# Altium footprint library Dart_Controller_Pcblib.PcbLib: 43 footprints (part 1 of 3)
Each footprint in its own frame and in the unit in brackets; x right, y up, seen from the top. Pads: shape width x height; smd on the part's side, far side on the other; paste and mask are expansions set on the pad; w line width, h text height; cw(c..) or ccw(c..) is an arc to the next point about the centre after c.
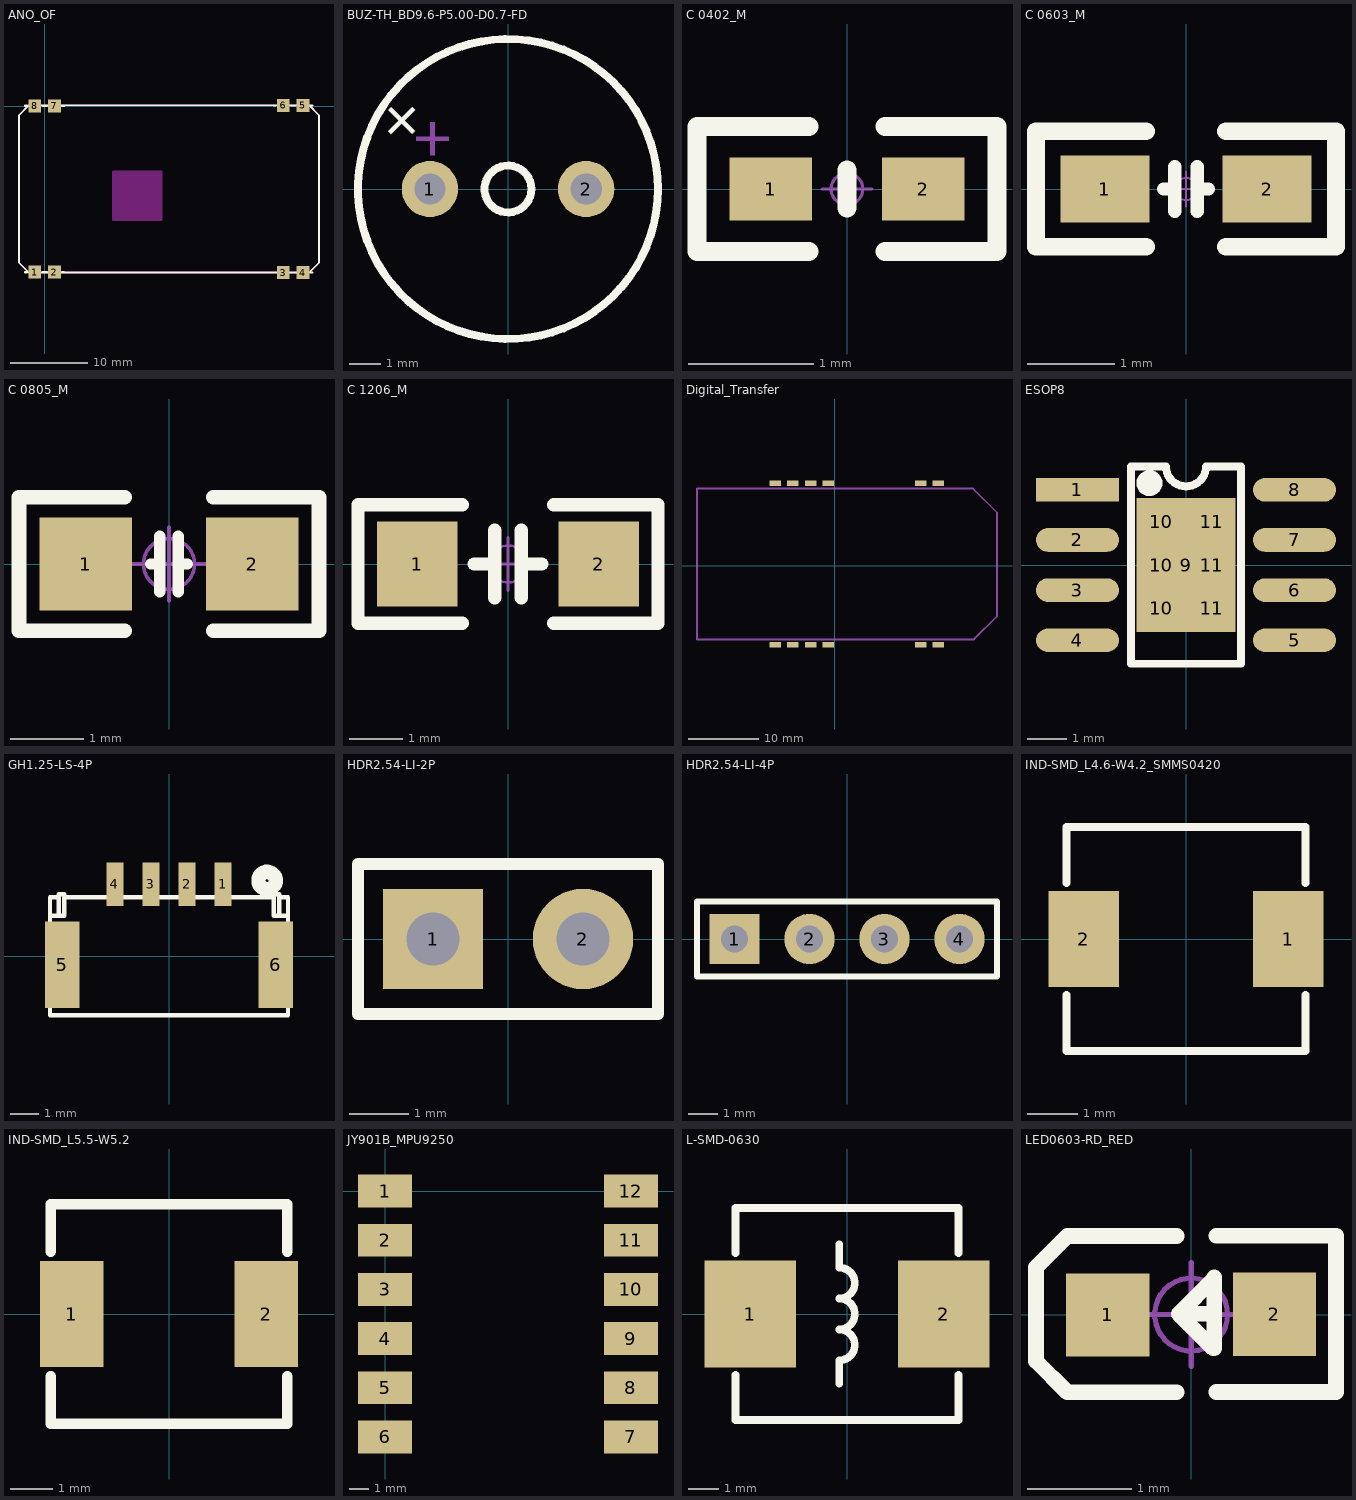
[diagram p0: the footprints below, top view; thin cyan lines are the x and y axes]

## ANO_OF [mil]
pads (8):
  rect 65x65 smd: 1(-50,-843) 2(50,-843) 3(1213,-845) 4(1313,-845) 5(1313,4) 6(1213,4) 7(50,2) 8(-50,2)
Top Overlay:
  lines w12: -98,-843 -89.5,-843 ; -98,2 -89,2 ; -10.5,-843 10.5,-843 ; -10.5,2 10.5,2 ; 89,-843 98,-843 ; 89.5,2 98,2 ; 1165,-845 1174,-845 ; 1165,4 1174,4 ; 1252.5,-845 1273.5,-845 ; 1252.5,4 1273.5,4 ; 1352.5,-845 1361,-845 ; 1352.5,4 1361,4
Top Overlay keep-out:
  lines w7.87: -130,-795 -80,-845 1345,-845 1395,-795 1395,-45 1345,5 -80,5 -130,-45 -130,-795
Keep-Out Layer:
  pour cut-out: 346,-580 596,-580 596,-330 346,-330
Keep-Out Layer:
  lines w8: 346,-580 346,-330 596,-330 596,-580 346,-580

## BUZ-TH_BD9.6-P5.00-D0.7-FD [mm]
pads (2):
  round 1.8 hole 1 paste-2539.97 mask+0.051: 1(-2.5,0) 2(2.5,0)
Top Overlay:
  circle w0.254: c0,0 r4.8
  circle w0.254: c0,0 r0.75
  text "+" at -2.481,2.059 h1.27
Mechanical 15:
  region: -2.484,1.084 -2.344,1.084 -2.344,2.134 -2.484,2.134 -2.484,2.114
  region: -2.939,1.679 -2.939,1.539 -1.889,1.539 -1.889,1.679 -1.909,1.679
3D body "Beeper_CORR.step": height 5.51, standoff -4.5, extent -4.5,-4.5 4.5,4.5

## C 0402_M [mil] "无极性贴片电容                                  淘宝ID:黄晶宝石"
pads (2):
  rect 26x20 smd: 1(-24,0) 2(24,0)
Top Overlay:
  lines w6: -12,-19.68 -47.24,-19.68 -47.24,19.68 -12,19.68 ; 0,-6 0,6 ; 12,-19.68 47.24,-19.68 47.24,19.68 12,19.68
Mechanical 15:
  circle w1: c0,0 r5
  lines w1: -7.87,0 7.87,0 ; 0,-7.87 0,7.87
3D body "C 0402.STEP": height 20.68, standoff 0.21, extent -19.69,-10.24 19.69,10.24

## C 0603_M [mil] "无极性贴片电容                                淘宝ID:黄晶宝石"
pads (2):
  rect 40x30 smd: 1(-36.5,0) 2(36.5,0)
Top Overlay:
  lines w6: -10,0 -5,0 ; -5,-10 -5,10 ; 5,-10 5,10 ; 5,0 10,0
  lines w8: -18,-26 -67.5,-26 -67.5,26 -18,26 ; 18,-26 67.5,-26 67.5,26 18,26
Mechanical 15:
  circle w1: c0,0 r5
  lines w1: -7.87,0 7.87,0 ; 0,-7.87 0,7.87
3D body "C 0603.STEP": height 31.89, standoff -0.39, extent -31.5,-16.14 31.5,16.14

## C 0805_M [mil] "无极性贴片电容                                         淘宝ID:黄晶宝石"
height 19.68
pads (2):
  rect 50x50 smd: 1(-45,0) 2(45,0)
Top Overlay:
  lines w6: -10,0 -5,0 ; -5,-15 -5,15 ; 5,-15 5,15 ; 5,0 10,0
  lines w8: -24,-36 -81,-36 -81,36 -24,36 ; 24,-36 81,-36 81,36 24,36
Mechanical 15:
  circle w1.97: c0,0 r13.78
  lines w1.97: -19.68,0 19.68,0 ; 0,-19.68 0,19.68
3D body "C 0805.STEP": height 20.08, standoff -0.39, extent -39.37,-24.02 39.37,24.02

## C 1206_M [mil] "无极性贴片电容"
pads (2):
  rect 60x62.99 smd: 1(-67.5,0) 2(67.5,0)
Top Overlay:
  lines w10: -34,-44 -111.5,-44 -111.5,44 -34,44 ; -25,0 -10,0 ; -10,-25 -10,25 ; 10,-25 10,25 ; 10,0 25,0 ; 34,-44 111.5,-44 111.5,44 34,44
Mechanical 15:
  circle w1.97: c0,0 r13.78
  lines w1.97: -19.68,0 19.68,0 ; 0,-19.68 0,19.68
3D body "C 1206.STEP": height 47.64, standoff -0.39, extent -62.99,-31.89 62.99,31.89

## Digital_Transfer [mil]
pads (12):
  rect 65x31.5 smd: 0(485,-445) 0(485,465) 0(585,-445) 0(585,465) 1(-335,-445) 2(-235,-445) 3(-135,-445) 4(-35,-445) 5(-35,465) 6(-135,465) 7(-235,465) 8(-335,465)
Mechanical 1:
  lines w10: -775,-415 785,-415 915,-285 915,300 780,435 -775,435 -775,-415

## ESOP8 [mm]
pads (15):
  rect 2.1x0.6 smd: 1(-2.75,1.905)
  oval 2.1x0.6 smd: 2(-2.75,0.635) 3(-2.75,-0.635) 4(-2.75,-1.905) 5(2.75,-1.905) 6(2.75,-0.635) 7(2.75,0.635) 8(2.75,1.905)
  rect 2.5x3.4 smd paste-2: 9(0,0)
  rect 0.9x0.7 on Top Paste: 10(-0.625,-1.1) 10(-0.625,0) 10(-0.625,1.1) 11(0.65,-1.1) 11(0.65,0) 11(0.65,1.1)
Top Overlay:
  circle w0.35: c-0.925,2.075 r0.155
  lines w0.2: -1.397,2.5 -1.397,-2.5 1.397,-2.5 1.397,2.5
  lines w0.203: -1.397,2.5 -0.508,2.5 ccw(c0,2.5) 0,1.992 ccw(c0,2.5) 0.508,2.5 1.397,2.5
Mechanical 15:
  circle w0.05: c0,0 r0.35
  lines w0.05: -0.5,0 0.5,0 ; 0,-0.5 0,0.5
3D body "ESOP8.STEP": height 1.53, standoff -0.01, extent -3.053,-2.5 2.953,2.5

## GH1.25-LS-4P [mm] "A1257WR-S-4P"
height 1.5
pads (6):
  rect 0.6x1.5 smd: 1(1.875,2.5) 2(0.625,2.5) 3(-0.625,2.5) 4(-1.875,2.5)
  rect 1.2x3 smd: 5(-3.7,-0.3) 6(3.7,-0.3)
Top Overlay:
  circle w0.5: c3.401,2.627 r0.3
  lines w0.102: -1.975,2.15 -1.975,2.85 -1.775,2.85 -1.775,2.15 ; -0.725,2.15 -0.725,2.85 -0.525,2.85 -0.525,2.15 ; 0.525,2.15 0.525,2.85 0.725,2.85 0.725,2.15 ; 1.775,2.15 1.775,2.85 1.975,2.85 1.975,2.15
  lines w0.152: -3.825,1.4 -3.825,2.15 -3.625,2.15 -3.625,2.05 ; -3.825,2.05 -4.125,2.05 -4.125,1.4 ; -1.975,2.05 -1.975,2.15 -1.775,2.15 -1.775,2.05 ; -0.725,2.05 -0.725,2.15 -0.525,2.15 -0.525,2.05 ; 0.525,2.05 0.525,2.15 0.725,2.15 0.725,2.05 ; 1.775,2.05 1.775,2.15 1.975,2.15 1.975,2.05 ; 3.825,1.4 3.825,2.15 3.625,2.15 3.625,2.05 ; 3.825,2.05 4.125,2.05 4.125,1.4 ; -4.125,1.4 -3.625,1.4 -3.625,2.05 ; -4.125,1.4 -4.125,-2.05 4.125,-2.05 4.125,1.4 ; -3.625,2.05 3.625,2.05 ; 3.625,2.05 3.625,1.4 4.125,1.4
3D body "A1257WR-S-4P.stp": height 4.2, standoff -0.7, extent -4.125,-2.15 4.125,2.25

## HDR2.54-LI-2P [mm] "封装库来自淘宝卖家 ID：黄晶宝石"
pads (2):
  rect 1.7x1.7 hole 0.9: 1(-1.27,0)
  round 1.7 hole 0.9: 2(1.27,0)
Top Overlay:
  lines w0.2: -2.54,-1.27 2.54,-1.27 2.54,1.27 -2.54,1.27 -2.54,-1.27
3D body "HDR2.54-1P.STEP": height 8.5, standoff -3, extent -2.54,-1.27 0,1.27
3D body "HDR2.54-1P.STEP": height 8.5, standoff -3, extent 0,-1.27 2.54,1.27

## HDR2.54-LI-4P [mm] "排针，4脚"
pads (4):
  rect 1.7x1.7 hole 0.9: 1(-3.81,0)
  round 1.7 hole 0.9: 2(-1.27,0) 3(1.27,0) 4(3.81,0)
Top Overlay:
  lines w0.2: -5.08,-1.27 -5.08,1.27 5.08,1.27 5.08,-1.27 -5.08,-1.27
3D body "HDR2.54-1P.STEP": height 8.5, standoff -3, extent -5.08,-1.27 -2.54,1.27
3D body "HDR2.54-1P.STEP": height 8.5, standoff -3, extent -2.54,-1.27 0,1.27
3D body "HDR2.54-1P.STEP": height 8.5, standoff -3, extent 0,-1.27 2.54,1.27
3D body "HDR2.54-1P.STEP": height 8.5, standoff -3, extent 2.54,-1.27 5.08,1.27

## IND-SMD_L4.6-W4.2_SMMS0420 [mm]
pads (2):
  rect 1.4x1.9 smd paste+0 mask+0.051: 1(2.032,0) 2(-2.032,0)
Top Overlay:
  lines w0.152: -2.376,-1.112 -2.376,-2.226 2.376,-2.226 2.376,-1.112 ; -2.376,1.112 -2.376,2.226 2.376,2.226 2.376,1.112
3D body "零件6.STEP": height 1.8, standoff 0, extent -2.2,-2.1 2.2,2.1

## IND-SMD_L5.5-W5.2 [mm]
pads (2):
  rect 1.5x2.5 smd paste+0 mask+0.051: 1(-2.3,0) 2(2.3,0)
Top Overlay:
  lines w0.254: -2.8,-1.481 -2.8,-2.6 2.8,-2.6 2.8,-1.481 ; -2.8,1.481 -2.8,2.6 2.8,2.6 2.8,1.481
3D body "SMD0530_CORR.step": height 3.01, standoff 0, extent -2.75,-2.6 2.75,2.6

## JY901B_MPU9250 [mm]
pads (12):
  rect 2.8x1.7 smd: 1(0,0) 2(0,-2.54) 3(0,-5.08) 4(0,-7.62) 5(0,-10.16) 6(0,-12.7) 7(12.7,-12.7) 8(12.7,-10.16) 9(12.7,-7.62) 10(12.7,-5.08) 11(12.7,-2.54) 12(12.7,0)

## L-SMD-0630 [mm] "一体化成型电感"
pads (2):
  rect 3x3.5 smd: 1(-3.175,0) 2(3.175,0)
Top Overlay:
  lines w0.254: -3.658,-2.007 -3.658,-3.48 3.658,-3.48 3.658,-2.007 ; -3.658,2.007 -3.658,3.48 3.658,3.48 3.658,2.007 ; -0.254,-2.286 -0.254,-1.524 ccw(c-0.254,-1.016) -0.254,-0.508 ccw(c-0.254,0) -0.254,0.508 ccw(c-0.254,1.016) -0.254,1.524 -0.254,2.286
3D body "SMD-0630.STEP": height 3.05, standoff 0.02, extent -3.475,-3.3 3.475,3.3

## LED0603-RD_RED [mm]
pads (2):
  rect 0.8x0.8 smd paste+0 mask+0.051: 1(-0.799,-0.003) 2(0.799,0.004)
Top Overlay:
  lines w0.15: -0.14,-0.746 -1.19,-0.746 -1.49,-0.446 -1.49,-0.346 -1.49,0.354 -1.49,0.454 -1.19,0.754 -0.14,0.754 ; 0.22,0.007 -0.12,0.007 ; 0.24,-0.744 1.39,-0.744 ; 0.24,0.757 1.39,0.757 1.39,-0.723 ; -0.12,0.007 0.22,0.347 0.22,0.357 0.22,-0.323 0.21,-0.323 -0.12,0.007
Mechanical 15:
  circle w0.05: c0,0 r0.35
  region: -1.07,0.062 -0.53,0.062 -0.53,-0.068 -1.07,-0.068
  region: 0.735,-0.267 0.735,0.273 0.865,0.273 0.865,-0.267
  region: 0.529,0.068 1.069,0.068 1.069,-0.062 0.529,-0.062
  lines w0.05: -0.5,0 0.5,0 ; 0,-0.5 0,0.5
3D body "LED 0603-R.STEP": height 0.47, standoff 0, extent -0.8,-0.401 0.8,0.401
3D body "LED 0603玻璃罩.": height 0, standoff 0, extent 0,0 0,0